# Altium footprint library LUMI_Standard_Auto_Soldering_LIB.PcbLib: 344 footprints (part 14 of 22)
Each footprint in its own frame and in the unit in brackets; x right, y up, seen from the top. Pads: shape width x height; smd on the part's side, far side on the other; paste and mask are expansions set on the pad; w line width, h text height; cw(c..) or ccw(c..) is an arc to the next point about the centre after c.
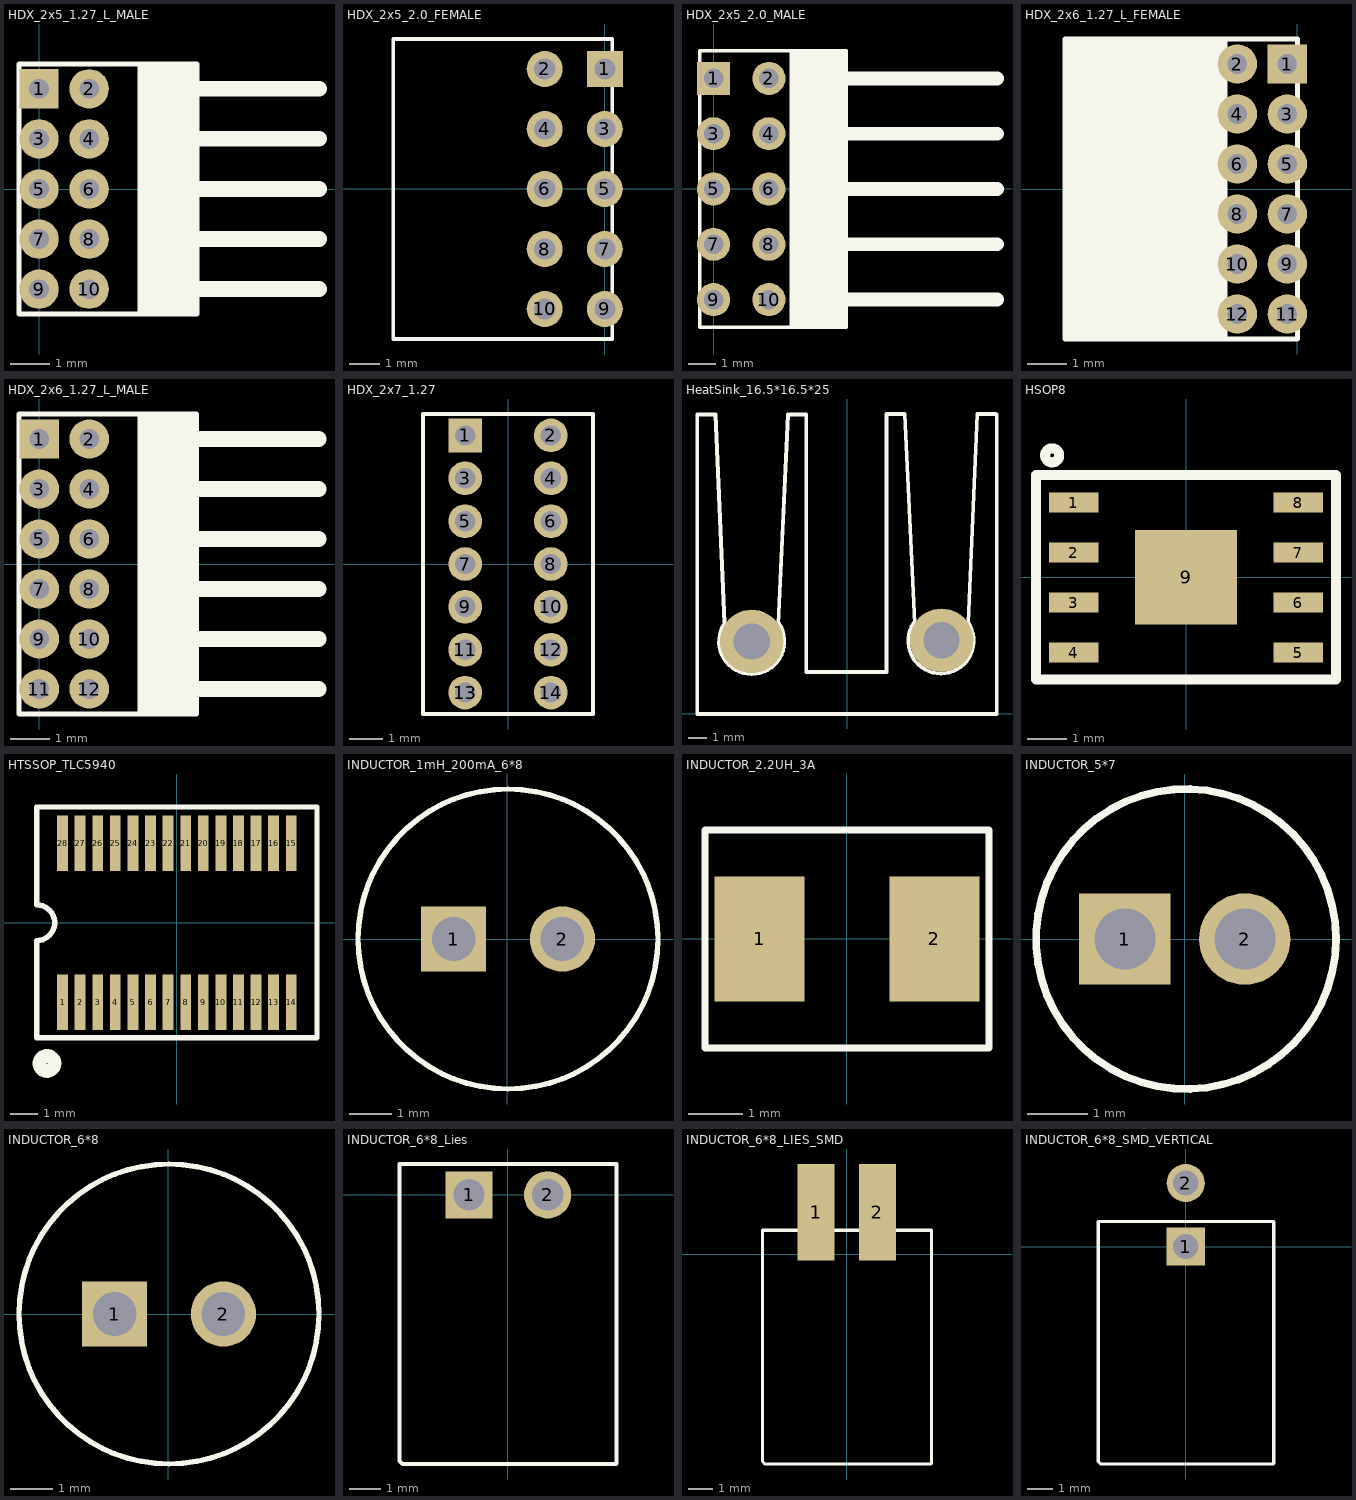
[diagram p13: the footprints below, top view; thin cyan lines are the x and y axes]

## HDX_2x5_1.27_L_MALE [mm]
pads (10):
  rect 1x1 hole 0.5 mask+0.07: 1(0,2.54)
  round 1 hole 0.5 mask+0.07: 2(1.27,2.54) 3(0,1.27) 4(1.27,1.27) 5(0,0) 6(1.27,0) 7(0,-1.27) 8(1.27,-1.27) 9(0,-2.54) 10(1.27,-2.54)
Top Overlay:
  rectangle: 2.5,-3.175 4,0.635
  rectangle: 2.5,0.635 4,3.175
  lines w0.127: 3.992,-3.175 -0.508,-3.175 -0.508,0.635 -0.508,3.175 3.992,3.175 ; 4,-3.175 4,0.635 4,3.175
  lines w0.4: 4,-2.537 7.1,-2.537 ; 4,-1.267 7.1,-1.267 ; 4,0.003 7.1,0.003 ; 4,1.273 7.1,1.273 ; 4,2.543 7.1,2.543
3D body: height 2.27, standoff -2, extent -0.199,-0.201 0.2,0.197
3D body: height 1, standoff -2, extent 1.052,-0.201 1.451,0.197
3D body: height 2.47, standoff 2.07, extent 0,-0.199 7.2,0.199
3D body: height 1.2, standoff 0.8, extent 1.27,-0.198 7.17,0.2
3D body: height 3.4, standoff 0, extent 2.5,-3.175 4,0.635
3D body: height 1, standoff -2, extent 1.052,-1.47 1.451,-1.072
3D body: height 2.27, standoff -2, extent -0.199,-1.47 0.2,-1.072
3D body: height 1.2, standoff 0.8, extent 1.27,-1.468 7.17,-1.07
3D body: height 2.47, standoff 2.07, extent 0,-1.469 7.2,-1.071
3D body: height 2.47, standoff 2.07, extent 0,1.071 7.2,1.469
3D body: height 1.2, standoff 0.8, extent 1.27,1.072 7.17,1.47
3D body: height 2.27, standoff -2, extent -0.199,1.07 0.2,1.468
3D body: height 1, standoff -2, extent 1.052,1.07 1.451,1.468
3D body: height 3.4, standoff 0, extent 2.5,0.635 4,3.175
3D body: height 1.2, standoff 0.8, extent 1.27,2.342 7.17,2.74
3D body: height 2.47, standoff 2.07, extent 0,2.341 7.2,2.739
3D body: height 1, standoff -2, extent 1.052,2.339 1.451,2.737
3D body: height 2.27, standoff -2, extent -0.199,2.339 0.2,2.737
3D body: height 2.47, standoff 2.07, extent 0,-2.739 7.2,-2.341
3D body: height 1.2, standoff 0.8, extent 1.27,-2.738 7.17,-2.34
3D body: height 2.27, standoff -2, extent -0.199,-2.74 0.2,-2.342
3D body: height 1, standoff -2, extent 1.052,-2.74 1.451,-2.342

## HDX_2x5_2.0_FEMALE [mm]
pads (10):
  rect 1.2x1.2 hole 0.7 mask+0.07: 1(0,4)
  round 1.2 hole 0.7 mask+0.07: 2(-2,4) 3(0,2) 4(-2,2) 5(0,0) 6(-2,0) 7(0,-2) 8(-2,-2) 9(0,-4) 10(-2,-4)
Top Overlay:
  lines w0.127: -7.05,-5 -7.05,-3 -7.05,1 -7.05,5 0.25,5 0.25,1 0.25,-3 0.25,-5 -7.05,-5
3D body: height 3, standoff -2, extent -2.249,-2.25 -1.75,-1.752
3D body: height 2, standoff -2, extent -0.249,-2.25 0.25,-1.752
3D body: height 2, standoff -2, extent -0.249,-0.25 0.25,0.248
3D body: height 3, standoff -2, extent -2.249,-0.25 -1.75,0.248
3D body: height 4.9, standoff 0, extent -7,-3 0.25,1
3D body: height 4.9, standoff 0, extent -7,1 0.25,5
3D body: height 3, standoff -2, extent -2.249,3.75 -1.75,4.248
3D body: height 2, standoff -2, extent -0.249,3.75 0.25,4.248
3D body: height 2, standoff -2, extent -0.249,1.75 0.25,2.248
3D body: height 3, standoff -2, extent -2.249,1.75 -1.75,2.248
3D body: height 2, standoff -2, extent -0.249,-4.25 0.25,-3.752
3D body: height 3, standoff -2, extent -2.249,-4.25 -1.75,-3.752
3D body: height 4.9, standoff 0, extent -7,-5 0.25,-3

## HDX_2x5_2.0_MALE [mm]
pads (10):
  rect 1.2x1.2 hole 0.7 mask+0.07: 1(0,4)
  round 1.2 hole 0.7 mask+0.07: 2(2,4) 3(0,2) 4(2,2) 5(0,0) 6(2,0) 7(0,-2) 8(2,-2) 9(0,-4) 10(2,-4)
Top Overlay:
  rectangle: 2.8,-3 4.8,1
  rectangle: 2.8,1 4.8,5
  rectangle: 2.8,-5 4.8,-3
  lines w0.127: 2.8,-5 2.8,-3 2.8,-1 2.8,1 2.8,3 2.8,5 ; -0.5,-5 -0.5,-3 -0.5,1 -0.5,5 4.8,5 4.8,1 4.8,-3 4.8,-5 -0.5,-5
  lines w0.5: 3,-4 10.25,-4 ; 3,-2 10.25,-2 ; 3,0 10.25,0 ; 3,2 10.25,2 ; 3,4 10.25,4
3D body: height 3.25, standoff 2.75, extent -0.499,-2.25 10.501,-1.752
3D body: height 1.25, standoff 0.75, extent 1.501,-2.25 10.501,-1.752
3D body: height 3, standoff -2, extent -0.249,-2.25 0.25,-1.752
3D body: height 2, standoff -2, extent 1.751,-2.25 2.25,-1.752
3D body: height 2, standoff -2, extent 1.751,-0.25 2.25,0.248
3D body: height 3, standoff -2, extent -0.249,-0.25 0.25,0.248
3D body: height 1.25, standoff 0.75, extent 1.501,-0.25 10.501,0.248
3D body: height 3.25, standoff 2.75, extent -0.499,-0.25 10.501,0.248
3D body: height 4, standoff 0, extent 2.75,-3 4.75,1
3D body: height 4, standoff 0, extent 2.75,1 4.75,5
3D body: height 3.25, standoff 2.75, extent -0.499,3.75 10.501,4.248
3D body: height 1.25, standoff 0.75, extent 1.501,3.75 10.501,4.248
3D body: height 3, standoff -2, extent -0.249,3.75 0.25,4.248
3D body: height 2, standoff -2, extent 1.751,3.75 2.25,4.248
3D body: height 2, standoff -2, extent 1.751,1.75 2.25,2.248
3D body: height 3, standoff -2, extent -0.249,1.75 0.25,2.248
3D body: height 1.25, standoff 0.75, extent 1.501,1.75 10.501,2.248
3D body: height 3.25, standoff 2.75, extent -0.499,1.75 10.501,2.248
3D body: height 2, standoff -2, extent 1.751,-4.25 2.25,-3.752
3D body: height 3, standoff -2, extent -0.249,-4.25 0.25,-3.752
3D body: height 1.25, standoff 0.75, extent 1.501,-4.25 10.501,-3.752
3D body: height 3.25, standoff 2.75, extent -0.499,-4.25 10.501,-3.752
3D body: height 4, standoff 0, extent 2.75,-5 4.75,-3

## HDX_2x6_1.27_L_FEMALE [mm]
pads (12):
  rect 1x1 hole 0.5 mask+0.07: 1(-0.254,3.175)
  round 1 hole 0.5 mask+0.07: 2(-1.524,3.175) 3(-0.254,1.905) 4(-1.524,1.905) 5(-0.254,0.635) 6(-1.524,0.635) 7(-0.254,-0.635) 8(-1.524,-0.635) 9(-0.254,-1.905) 10(-1.524,-1.905) 11(-0.254,-3.175) 12(-1.524,-3.175)
Top Overlay:
  region: -1.778,3.81 -5.9,3.81 -5.9,-3.81 -1.778,-3.81
  lines w0.127: -5.9,-3.81 0,-3.81 0,1.27 0,3.81 -5.9,3.81 -5.9,1.27 -5.9,-3.81
3D body: height 1.2, standoff 0.8, extent -5.974,-3.375 -1.524,-2.977
3D body: height 2.27, standoff -2, extent -0.454,-3.374 -0.055,-2.976
3D body: height 1, standoff -2, extent -1.705,-3.374 -1.306,-2.976
3D body: height 2.47, standoff 2.07, extent -6.004,-3.376 -0.254,-2.978
3D body: height 2.47, standoff 2.07, extent -6.004,-2.106 -0.254,-1.708
3D body: height 1, standoff -2, extent -1.705,-2.104 -1.306,-1.706
3D body: height 2.27, standoff -2, extent -0.454,-2.104 -0.055,-1.706
3D body: height 1.2, standoff 0.8, extent -5.974,-2.105 -1.524,-1.707
3D body: height 2.47, standoff 2.07, extent -6.004,-0.836 -0.254,-0.438
3D body: height 1, standoff -2, extent -1.705,-0.834 -1.306,-0.436
3D body: height 2.27, standoff -2, extent -0.454,-0.834 -0.055,-0.436
3D body: height 1.2, standoff 0.8, extent -5.974,-0.835 -1.524,-0.437
3D body: height 2.47, standoff 2.07, extent -6.004,0.434 -0.254,0.832
3D body: height 1, standoff -2, extent -1.705,0.436 -1.306,0.834
3D body: height 2.27, standoff -2, extent -0.454,0.436 -0.055,0.834
3D body: height 1.2, standoff 0.8, extent -5.974,0.435 -1.524,0.833
3D body: height 2.47, standoff 2.07, extent -6.004,1.704 -0.254,2.102
3D body: height 1, standoff -2, extent -1.705,1.706 -1.306,2.104
3D body: height 2.27, standoff -2, extent -0.454,1.706 -0.055,2.104
3D body: height 1.2, standoff 0.8, extent -5.974,1.705 -1.524,2.103
3D body: height 3.4, standoff 0, extent -5.9,-3.81 -1.778,3.81
3D body: height 1.2, standoff 0.8, extent -5.974,2.975 -1.524,3.373
3D body: height 2.27, standoff -2, extent -0.454,2.976 -0.055,3.374
3D body: height 1, standoff -2, extent -1.705,2.976 -1.306,3.374
3D body: height 2.47, standoff 2.07, extent -6.004,2.974 -0.254,3.372

## HDX_2x6_1.27_L_MALE [mm]
pads (12):
  rect 1x1 hole 0.5 mask+0.07: 1(0,3.175)
  round 1 hole 0.5 mask+0.07: 2(1.27,3.175) 3(0,1.905) 4(1.27,1.905) 5(0,0.635) 6(1.27,0.635) 7(0,-0.635) 8(1.27,-0.635) 9(0,-1.905) 10(1.27,-1.905) 11(0,-3.175) 12(1.27,-3.175)
Top Overlay:
  rectangle: 2.5,1.27 4,3.81
  rectangle: 2.5,-3.81 4,1.27
  lines w0.127: 3.992,-3.81 -0.508,-3.81 -0.508,1.27 -0.508,3.81 3.992,3.81 ; 4,-3.81 4,1.27 4,3.81
  lines w0.4: 4,-3.172 7.1,-3.172 ; 4,-1.902 7.1,-1.902 ; 4,-0.632 7.1,-0.632 ; 4,0.638 7.1,0.638 ; 4,1.908 7.1,1.908 ; 4,3.178 7.1,3.178
3D body: height 2.47, standoff 2.07, extent 0,-3.374 7.2,-2.976
3D body: height 1.2, standoff 0.8, extent 1.27,-3.373 7.17,-2.975
3D body: height 2.27, standoff -2, extent -0.199,-3.375 0.2,-2.977
3D body: height 1, standoff -2, extent 1.052,-3.375 1.451,-2.977
3D body: height 1, standoff -2, extent 1.052,-2.105 1.451,-1.707
3D body: height 2.27, standoff -2, extent -0.199,-2.105 0.2,-1.707
3D body: height 1.2, standoff 0.8, extent 1.27,-2.103 7.17,-1.705
3D body: height 2.47, standoff 2.07, extent 0,-2.104 7.2,-1.706
3D body: height 2.27, standoff -2, extent -0.199,2.974 0.2,3.372
3D body: height 1, standoff -2, extent 1.052,2.974 1.451,3.372
3D body: height 2.47, standoff 2.07, extent 0,2.976 7.2,3.374
3D body: height 1.2, standoff 0.8, extent 1.27,2.977 7.17,3.375
3D body: height 3.4, standoff 0, extent 2.5,1.27 4,3.81
3D body: height 1, standoff -2, extent 1.052,1.705 1.451,2.103
3D body: height 2.27, standoff -2, extent -0.199,1.705 0.2,2.103
3D body: height 1.2, standoff 0.8, extent 1.27,1.707 7.17,2.105
3D body: height 2.47, standoff 2.07, extent 0,1.706 7.2,2.104
3D body: height 2.47, standoff 2.07, extent 0,-0.834 7.2,-0.436
3D body: height 1.2, standoff 0.8, extent 1.27,-0.833 7.17,-0.435
3D body: height 2.27, standoff -2, extent -0.199,-0.835 0.2,-0.437
3D body: height 1, standoff -2, extent 1.052,-0.835 1.451,-0.437
3D body: height 3.4, standoff 0, extent 2.5,-3.81 4,1.27
3D body: height 1.2, standoff 0.8, extent 1.27,0.437 7.17,0.835
3D body: height 2.47, standoff 2.07, extent 0,0.436 7.2,0.834
3D body: height 1, standoff -2, extent 1.052,0.434 1.451,0.832
3D body: height 2.27, standoff -2, extent -0.199,0.434 0.2,0.832

## HDX_2x7_1.27 [mm]
pads (14):
  rect 1x1 hole 0.6 mask+0.07: 1(-1.27,3.81)
  round 1 hole 0.6 mask+0.07: 2(1.27,3.81) 3(-1.27,2.54) 4(1.27,2.54) 5(-1.27,1.27) 6(1.27,1.27) 7(-1.27,0) 8(1.27,0) 9(-1.27,-1.27) 10(1.27,-1.27) 11(-1.27,-2.54) 12(1.27,-2.54) 13(-1.27,-3.81) 14(1.27,-3.81)
Top Overlay:
  lines w0.127: -0.02,-4.445 -2.52,-4.445 -2.52,-0.635 -2.52,1.905 -2.52,4.445 -0.02,4.445 ; 0.02,-4.445 2.52,-4.445 2.52,-0.635 2.52,1.905 2.52,4.445 0.02,4.445

## HeatSink_16.5*16.5*25 [mm]
pads (2):
  round 3.5 hole 2: ""(-5.255,4) ""(5.207,4.064)
Top Overlay:
  lines w0.203: -5.255,4.953 -3.802,4.953 -3.255,16.5 -2.255,16.5 -2.255,2.317 2.173,2.317 ; -3.748,4.989 cw(c-5.255,4) -6.755,5 -7.255,16.5 -8.255,16.5 -8.255,0 8.245,0 8.245,16.5 ; 2.173,2.348 2.173,16.531 3.173,16.531 3.72,4.984 ; 3.666,5.02 ccw(c5.173,4.031) 6.673,5.031 7.173,16.531 8.173,16.531
3D body: height 25, standoff 0, extent -8.255,0 8.255,16.51
3D body: height 0, standoff -3, extent -6.049,3.202 -4.455,4.798
3D body: height 0, standoff -3, extent 4.413,3.266 6.007,4.862

## HSOP8 [mm]
pads (9):
  rect 1.25x0.5 smd: 1(-2.85,1.9) 2(-2.85,0.63) 3(-2.85,-0.64) 4(-2.85,-1.91) 5(2.85,-1.91) 6(2.85,-0.64) 7(2.85,0.63) 8(2.85,1.9)
  rect 2.6x2.4 smd: 9(0,0)
Top Overlay:
  circle w0.254: c-3.4,3.1 r0.18
  lines w0.254: -3.81,-2.6 3.81,-2.6 3.81,2.6 -3.81,2.6 -3.81,-2.6
3D body: height 1.75, standoff 0, extent -3.1,-2.5 3.1,2.5

## HTSSOP_TLC5940 [mm] "SSOP, Plastic; 28 Leads; Body Width 5.3 mm; Pitch 0.65 mm"
height 1.99
pads (28):
  rect 0.4x2.05 smd: 1(-4.225,-2.943) 2(-3.575,-2.943) 3(-2.925,-2.943) 4(-2.275,-2.943) 5(-1.625,-2.943) 6(-0.975,-2.943) 7(-0.325,-2.943) 8(0.325,-2.943) 9(0.975,-2.943) 10(1.625,-2.943) 11(2.275,-2.943) 12(2.925,-2.943) 13(3.575,-2.943) 14(4.225,-2.943) 15(4.225,2.943) 16(3.575,2.943) 17(2.925,2.943) 18(2.275,2.943) 19(1.625,2.943) 20(0.975,2.943) 21(0.325,2.943) 22(-0.325,2.943) 23(-0.975,2.943) 24(-1.625,2.943) 25(-2.275,2.943) 26(-2.925,2.943) 27(-3.575,2.943) 28(-4.225,2.943)
Top Overlay:
  circle w0.5: c-4.8,-5.2 r0.28
  lines w0.2: -5.175,-4.25 5.175,-4.25 5.175,4.275 -5.175,4.275 -5.175,0.658 cw(c-5.175,0) -5.175,-0.658 -5.175,-4.25
3D body: height 0.25, standoff 0, extent -3.759,-3.048 -3.378,-1.651
3D body: height 0.25, standoff 0, extent -4.42,-3.048 -4.039,-1.651
3D body: height 0.25, standoff 0, extent -3.124,-3.073 -2.743,-1.676
3D body: height 0.25, standoff 0, extent -2.464,-3.073 -2.083,-1.676
3D body: height 0.25, standoff 0, extent -1.829,-3.073 -1.448,-1.676
3D body: height 0.25, standoff 0, extent -1.168,-3.073 -0.787,-1.676
3D body: height 0.25, standoff 0, extent -0.508,-3.073 -0.127,-1.676
3D body: height 0.25, standoff 0, extent 0.152,-3.073 0.533,-1.676
3D body: height 0.25, standoff 0, extent 0.762,-3.073 1.143,-1.676
3D body: height 0.25, standoff 0, extent 1.422,-3.073 1.803,-1.676
3D body: height 0.25, standoff 0, extent 2.083,-3.073 2.464,-1.676
3D body: height 0.25, standoff 0, extent 2.743,-3.073 3.124,-1.676
3D body: height 0.25, standoff 0, extent 3.378,-3.073 3.759,-1.676
3D body: height 0.25, standoff 0, extent 4.039,-3.073 4.42,-1.676
3D body: height 1.02, standoff 0.23, extent -5.143,-1.778 5.144,1.778
3D body: height 0.25, standoff 0, extent 4.039,1.499 4.42,2.896
3D body: height 0.25, standoff 0, extent 3.378,1.499 3.759,2.896
3D body: height 0.25, standoff 0, extent 2.743,1.499 3.124,2.896
3D body: height 0.25, standoff 0, extent 2.083,1.499 2.464,2.896
3D body: height 0.25, standoff 0, extent 1.422,1.499 1.803,2.896
3D body: height 0.25, standoff 0, extent 0.762,1.499 1.143,2.896
3D body: height 0.25, standoff 0, extent 0.152,1.499 0.533,2.896
3D body: height 0.25, standoff 0, extent -0.508,1.499 -0.127,2.896
3D body: height 0.25, standoff 0, extent -1.168,1.499 -0.787,2.896
3D body: height 0.25, standoff 0, extent -1.829,1.499 -1.448,2.896
3D body: height 0.25, standoff 0, extent -2.464,1.499 -2.083,2.896
3D body: height 0.25, standoff 0, extent -3.124,1.499 -2.743,2.896
3D body: height 0.25, standoff 0, extent -4.432,1.499 -4.051,2.896
3D body: height 0.25, standoff 0, extent -3.772,1.499 -3.391,2.896

## INDUCTOR_1mH_200mA_6*8 [mil]
pads (2):
  rect 60x60 hole 40: 1(-49.21,0)
  round 60 hole 40: 2(50.79,0)
Top Overlay:
  circle w5: c0.79,0 r137.8
3D body: height 78.74, standoff -118.11, extent 39.08,-11.78 62.6,11.8
3D body: height 78.74, standoff -118.11, extent -60.92,-11.78 -37.4,11.8
3D body: height 401.57, standoff 7.87, extent -135.91,-137.52 138.59,137.53

## INDUCTOR_2.2UH_3A [mm] "4mmx4mm"
pads (2):
  rect 1.65x2.3 smd mask+0.07: 1(-1.6,0) 2(1.6,0)
Top Overlay:
  lines w0.127: -2.6,-2 2.6,-2 2.6,2 -2.6,2 -2.6,-2
3D body: height 1.2, standoff 0, extent -2.2,-2 2.2,2

## INDUCTOR_5*7 [mil]
pads (2):
  rect 60x60 hole 40: 1(-39.37,0)
  round 60 hole 40: 2(39.37,0)
Top Overlay:
  circle w5: c0.79,0 r98.43
3D body: height 78.74, standoff -118.11, extent 27.66,-11.78 51.19,11.8
3D body: height 78.74, standoff -118.11, extent -51.08,-11.78 -27.55,11.79
3D body: height 401.57, standoff 7.87, extent -96.85,-98.22 99.22,98.24

## INDUCTOR_6*8 [mil]
pads (2):
  rect 60x60 hole 40: 1(-49.21,0)
  round 60 hole 40: 2(50.79,0)
Top Overlay:
  circle w5: c0.79,0 r137.8
3D body: height 401.57, standoff 7.87, extent -135.91,-137.52 138.59,137.53
3D body: height 78.74, standoff -118.11, extent -60.92,-11.78 -37.4,11.8
3D body: height 78.74, standoff -118.11, extent 39.08,-11.78 62.6,11.8

## INDUCTOR_6*8_Lies [mil]
pads (2):
  rect 60x60 hole 40: 1(-49.21,0)
  round 60 hole 40: 2(50.79,0)
Top Overlay:
  lines w5: -137.8,-338.58 -137.8,39.37 138.58,39.37 138.58,-341.73 137.8,-342.52 -133.86,-342.52 -137.8,-338.58
3D body: height 275.32, standoff 0.27, extent -133.32,-338.58 141.19,-23.62
3D body: height 78.74, standoff -118.11, extent -60.92,-11.78 -37.4,11.8
3D body: height 78.74, standoff -118.11, extent 39.08,-11.78 62.6,11.8

## INDUCTOR_6*8_LIES_SMD [mm]
pads (2):
  rect 1.524x4 smd: 1(-1.275,1.75) 2(1.275,1.75)
Top Overlay:
  lines w0.127: -3.5,-8.6 -3.5,1 3.52,1 3.52,-8.68 3.5,-8.7 -3.4,-8.7 -3.5,-8.6
3D body: height 2, standoff -3, extent -1.547,-0.299 -0.95,0.3
3D body: height 2, standoff -3, extent 0.993,-0.299 1.59,0.3
3D body: height 6.99, standoff 0.01, extent -3.386,-8.6 3.586,-0.6

## INDUCTOR_6*8_SMD_VERTICAL [mil]
pads (2):
  rect 60x60 hole 40: 1(0,0)
  round 60 hole 40: 2(0,100)
Top Overlay:
  lines w5: -137.8,-338.58 -133.86,-342.52 137.8,-342.52 138.58,-341.73 138.58,39.37 -137.8,39.37 -137.8,-338.58
3D body: height 78.74, standoff -118.11, extent -11.8,-11.71 11.78,11.82
3D body: height 78.74, standoff -118.11, extent -11.8,88.29 11.78,111.82
3D body: height 275.32, standoff 0.27, extent -133.32,-338.58 141.19,-23.62